# Altium footprint library MOTHER_BOARD_LS1021_v1.0.PcbLib: 69 footprints (part 2 of 5)
Each footprint in its own frame and in the unit in brackets; x right, y up, seen from the top. Pads: shape width x height; smd on the part's side, far side on the other; paste and mask are expansions set on the pad; w line width, h text height; cw(c..) or ccw(c..) is an arc to the next point about the centre after c.
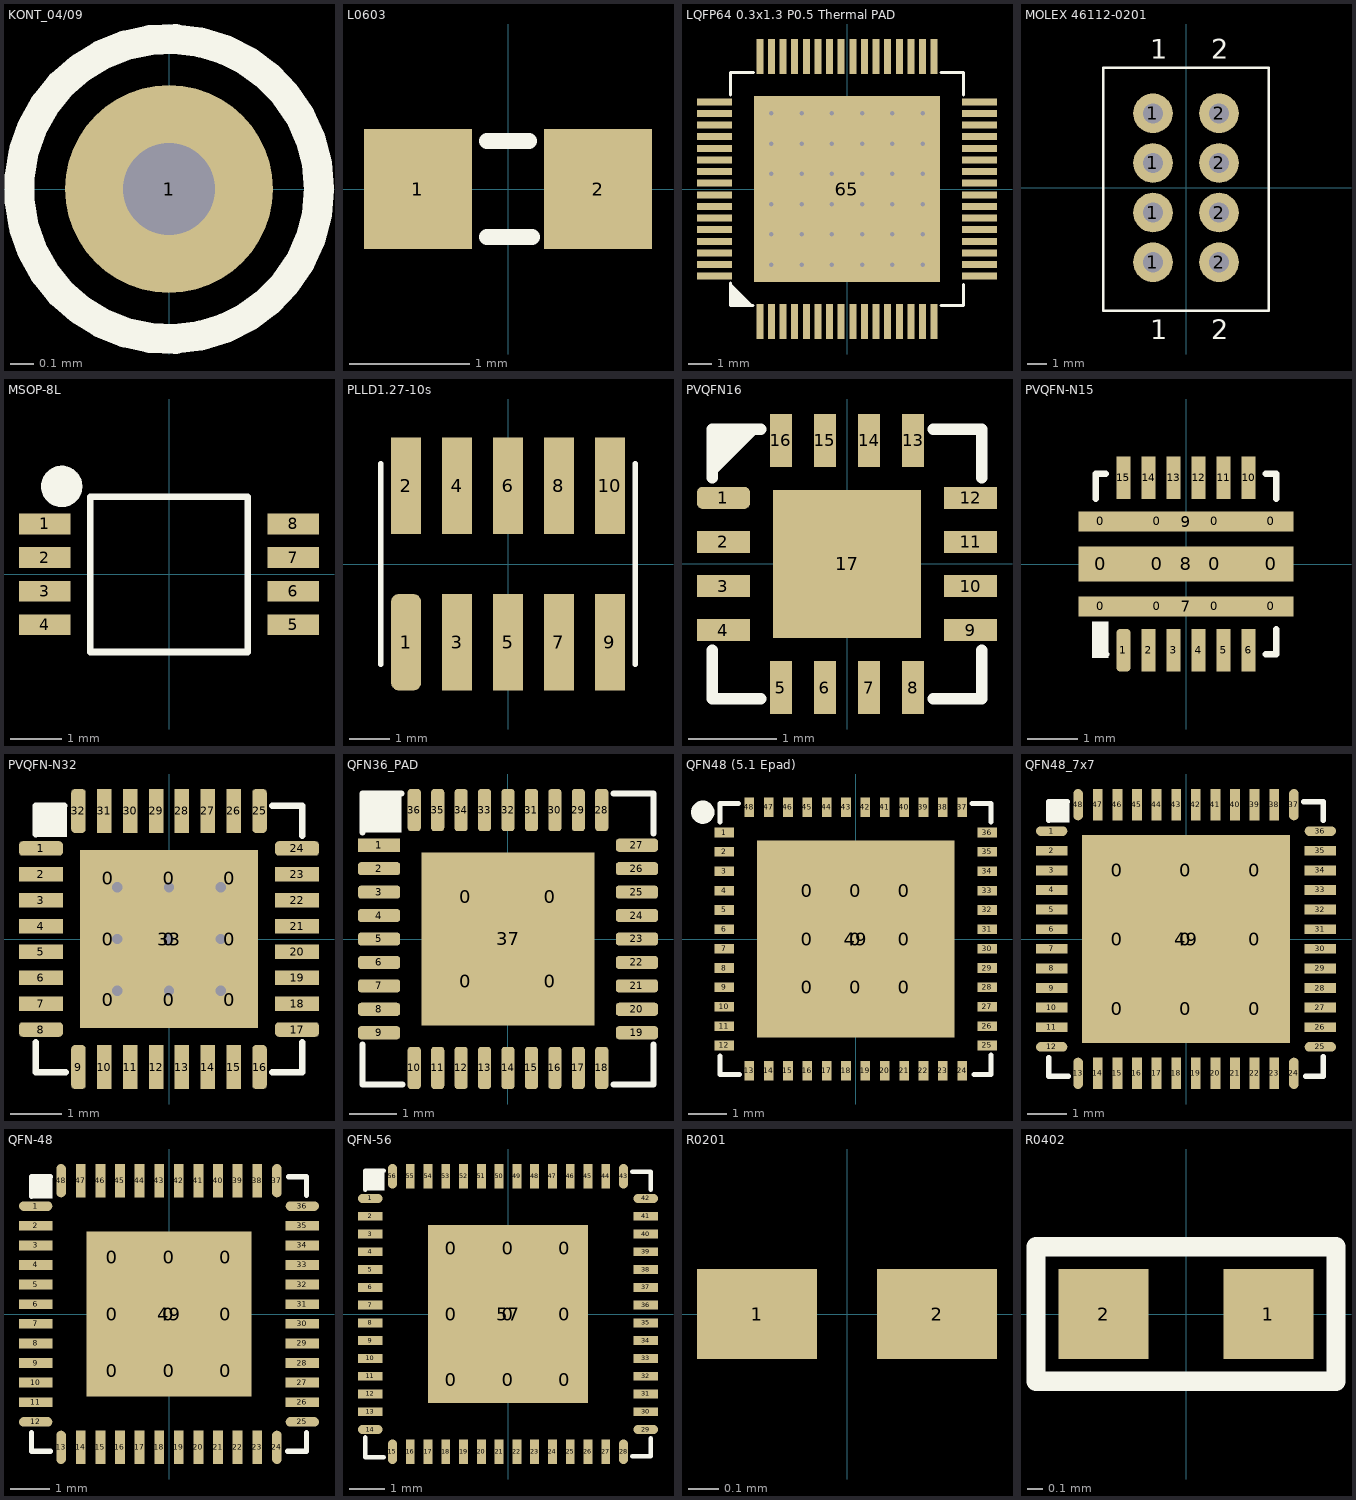
[diagram p1: the footprints below, top view; thin cyan lines are the x and y axes]

## KONT_04/09 [mm]
height 2.7
pads (1):
  round 0.9 hole 0.4: 1(0,0)
Top Overlay:
  circle w0.13: c0,0 r0.65

## L0603 [mm] "Ferrite bead"
height 0.8
pads (2):
  rect 0.9x1 smd paste-0.05 mask+0.05: 1(-0.75,0) 2(0.75,0)
Top Overlay:
  lines w0.13: -0.175,-0.4 0.2,-0.4 ; -0.175,0.4 0.175,0.4
3D body "BLM18P.STEP": height 0.8, standoff -0.01, extent -0.8,-0.41 0.8,0.4

## LQFP64 0.3x1.3 P0.5 Thermal PAD [mm] "TFP410MPAPREP"
height 14.5
pads (65):
  rect 0.3x1.5 smd paste+0 mask+0.05: 1(-3.75,-5.7) 2(-3.25,-5.7) 3(-2.75,-5.7) 4(-2.25,-5.7) 5(-1.75,-5.7) 6(-1.25,-5.7) 7(-0.75,-5.7) 8(-0.25,-5.7) 9(0.25,-5.7) 10(0.75,-5.7) 11(1.25,-5.7) 12(1.75,-5.7) 13(2.25,-5.7) 14(2.75,-5.7) 15(3.25,-5.7) 16(3.75,-5.7) 33(3.75,5.7) 34(3.25,5.7) 35(2.75,5.7) 36(2.25,5.7) 37(1.75,5.7) 38(1.25,5.7) 39(0.75,5.7) 40(0.25,5.7) 41(-0.25,5.7) 42(-0.75,5.7) 43(-1.25,5.7) 44(-1.75,5.7) 45(-2.25,5.7) 46(-2.75,5.7) 47(-3.25,5.7) 48(-3.75,5.7)
  rect 1.5x0.3 smd paste+0 mask+0.05: 17(5.7,-3.75) 18(5.7,-3.25) 19(5.7,-2.75) 20(5.7,-2.25) 21(5.7,-1.75) 22(5.7,-1.25) 23(5.7,-0.75) 24(5.7,-0.25) 25(5.7,0.25) 26(5.7,0.75) 27(5.7,1.25) 28(5.7,1.75) 29(5.7,2.25) 30(5.7,2.75) 31(5.7,3.25) 32(5.7,3.75) 49(-5.7,3.75) 50(-5.7,3.25) 51(-5.7,2.75) 52(-5.7,2.25) 53(-5.7,1.75) 54(-5.7,1.25) 55(-5.7,0.75) 56(-5.7,0.25) 57(-5.7,-0.25) 58(-5.7,-0.75) 59(-5.7,-1.25) 60(-5.7,-1.75) 61(-5.7,-2.25) 62(-5.7,-2.75) 63(-5.7,-3.25) 64(-5.7,-3.75)
  rect 8x8 smd paste-1.5 mask-1.5: 65(0,0)
via 0.65,-0.65 diameter 0.45 hole 0.2
via 0.65,0.65 diameter 0.45 hole 0.2
via 0.65,1.95 diameter 0.45 hole 0.2
via 0.65,3.25 diameter 0.45 hole 0.2
via -0.65,3.25 diameter 0.45 hole 0.2
via -1.95,3.25 diameter 0.45 hole 0.2
via -3.25,3.25 diameter 0.45 hole 0.2
via 1.95,3.25 diameter 0.45 hole 0.2
via 3.25,3.25 diameter 0.45 hole 0.2
via 3.25,1.95 diameter 0.45 hole 0.2
via 1.95,1.95 diameter 0.45 hole 0.2
via 1.95,0.65 diameter 0.45 hole 0.2
via 3.25,0.65 diameter 0.45 hole 0.2
via 3.25,-0.65 diameter 0.45 hole 0.2
via 1.95,-0.65 diameter 0.45 hole 0.2
via 1.95,-1.95 diameter 0.45 hole 0.2
via 3.25,-1.95 diameter 0.45 hole 0.2
via 3.25,-3.25 diameter 0.45 hole 0.2
via 1.95,-3.25 diameter 0.45 hole 0.2
via 0.65,-3.25 diameter 0.45 hole 0.2
via -0.65,-3.25 diameter 0.45 hole 0.2
via -1.95,-3.25 diameter 0.45 hole 0.2
via -3.25,-3.25 diameter 0.45 hole 0.2
via -3.25,-1.95 diameter 0.45 hole 0.2
via -3.25,-0.65 diameter 0.45 hole 0.2
via -3.25,0.65 diameter 0.45 hole 0.2
via -3.25,1.95 diameter 0.45 hole 0.2
via -1.95,1.95 diameter 0.45 hole 0.2
via -1.95,0.65 diameter 0.45 hole 0.2
via -1.95,-0.65 diameter 0.45 hole 0.2
via -1.95,-1.95 diameter 0.45 hole 0.2
via -0.65,-1.95 diameter 0.45 hole 0.2
via -0.65,-0.65 diameter 0.45 hole 0.2
via -0.65,0.65 diameter 0.45 hole 0.2
via -0.65,1.95 diameter 0.45 hole 0.2
via 0.65,-1.95 diameter 0.45 hole 0.2
Top Overlay:
  region: -5,-4.05 -4.05,-5 -5,-5
  lines w0.13: -5,-4.05 -5,-5 -4.05,-5 ; -5,4.05 -5,5 -4.025,5 ; -4.25,-5 -4.15,-5 ; 4.05,-5 5,-5 5,-4.1 ; 4.05,5 5,5 5,4.05
3D body "LQFP-64.step": height 1.56, standoff 0, extent -6,-6 6,6

## MOLEX 46112-0201 [mm]
height 14.5
pads (8):
  round 2 hole 1.02 paste-0.1 mask+0.05: 1(-1.665,-3.75) 1(-1.665,-1.25) 1(-1.665,1.25) 1(-1.665,3.75) 2(1.665,-3.75) 2(1.665,-1.25) 2(1.665,1.25) 2(1.665,3.75)
Top Overlay:
  lines w0.13: -4.166,-6.2 -4.166,6.05 4.165,6.05 4.165,-6.2 -4.166,-6.2
  text "1" at -1.8,-7.625 h1
  text "2" at 1.275,-7.625 h1
  text "2" at 1.275,6.5 h1
  text "1" at -1.8,6.5 h1
3D body "461120201.stp": height 15.22, standoff -2.58, extent -4.166,-6.196 4.166,6.047

## MSOP-8L [mm]
height 0.975
pads (8):
  rect 1x0.4 smd paste-0.05 mask+0.05: 1(-2.4,0.975) 2(-2.4,0.325) 3(-2.4,-0.325) 4(-2.4,-0.975) 5(2.4,-0.975) 6(2.4,-0.325) 7(2.4,0.325) 8(2.4,0.975)
Top Overlay:
  circle w0.4: c-2.075,1.7 r0.2
  lines w0.13: -1.525,-1.5 -1.525,1.5 1.525,1.5 1.525,-1.5 -1.525,-1.5
3D body "WE-TVS_Super_Speed_MSOP-8L.stp": height 0.94, standoff -0.04, extent -2.45,-1.5 2.45,1.5

## PLLD1.27-10s [mm]
height 14.5
pads (10):
  rrect50% 0.75x2.4 smd mask+0.05: 1(-2.54,-1.95)
  rect 0.75x2.4 smd mask+0.05: 2(-2.54,1.95) 3(-1.27,-1.95) 4(-1.27,1.95) 5(0,-1.95) 6(0,1.95) 7(1.27,-1.95) 8(1.27,1.95) 9(2.54,-1.95) 10(2.54,1.95)
Top Overlay:
  lines w0.13: -3.175,-2.5 -3.175,2.5 ; 3.175,-2.5 3.175,2.5
3D body "PLLD1_27-10-S.step": height 3.9, standoff 0, extent -3.185,-2.5 3.165,2.5

## PVQFN16 [mm]
height 14.5
pads (17):
  rrect50% 0.6x0.25 smd paste+0 mask+0.05: 1(-1.4,0.75)
  rect 0.6x0.25 smd paste+0 mask+0.05: 2(-1.4,0.25) 3(-1.4,-0.25) 4(-1.4,-0.75) 9(1.4,-0.75) 10(1.4,-0.25) 11(1.4,0.25) 12(1.4,0.75)
  rect 0.25x0.6 smd paste+0 mask+0.05: 5(-0.75,-1.4) 6(-0.25,-1.4) 7(0.25,-1.4) 8(0.75,-1.4) 13(0.75,1.4) 14(0.25,1.4) 15(-0.25,1.4) 16(-0.75,1.4)
  rect 1.68x1.68 smd paste-0.065 mask+0.05: 17(0,0)
Top Overlay:
  region: -1.524,1.521 -1.525,1.52 -1.525,0.975 -0.975,1.525
  lines w0.13: -1.525,-0.975 -1.525,-1.525 -0.975,-1.525 ; -1.525,0.975 -1.525,1.525 -0.975,1.525 ; 0.975,-1.525 1.525,-1.525 1.525,-0.975 ; 0.975,1.525 1.525,1.525 1.525,0.975
3D body "QFN-16_3x3.STEP": height 0.9, standoff 0, extent -1.524,-1.521 1.518,1.521

## PVQFN-N15 [mm]
height 14.5
pads (27):
  rect 0.8x0.3 on Top Paste paste+0 mask+0: 0(-1.7,-0.85) 0(-1.7,0.85) 0(1.7,-0.85) 0(1.7,0.85)
  rect 0.8x0.55 on Top Paste paste+0 mask+0: 0(-1.7,0) 0(1.7,0)
  rect 0.85x0.3 on Top Paste paste+0 mask+0: 0(-0.58,-0.85) 0(-0.58,0.85) 0(0.58,-0.85) 0(0.58,0.85)
  rect 0.85x0.55 on Top Paste paste+0 mask+0: 0(-0.58,0) 0(0.58,0)
  rrect50% 0.28x0.85 smd paste-0.03 mask+0.05: 1(-1.25,-1.725)
  rect 0.28x0.85 smd paste-0.03 mask+0.05: 2(-0.75,-1.725) 3(-0.25,-1.725) 4(0.25,-1.725) 5(0.75,-1.725) 6(1.25,-1.725) 10(1.25,1.725) 11(0.75,1.725) 12(0.25,1.725) 13(-0.25,1.725) 14(-0.75,1.725) 15(-1.25,1.725)
  rect 4.3x0.4 smd paste-10 mask+0.05: 7(0,-0.85) 9(0,0.85)
  rect 4.3x0.7 smd paste-10 mask+0.05: 8(0,0)
Top Overlay:
  region: -1.875,-1.15 -1.55,-1.15 -1.55,-1.875 -1.875,-1.875
  lines w0.13: -1.8,-1.3 -1.8,-1.8 -1.6,-1.8 ; -1.8,1.3 -1.8,1.8 -1.6,1.8 ; 1.6,-1.8 1.8,-1.8 1.8,-1.3 ; 1.6,1.8 1.8,1.8 1.8,1.3
3D body "PVQFN-N15(корпус).STEP": height 1, standoff 0, extent -1.8,-1.8 1.8,1.8

## PVQFN-N32 [mm] "PQFN, 32-Leads, Body 5,00x5,00mm, Pitch 0,50mm, Thermal Pad 3,45x3,45mm, IPC Medium Density"
height 1
pads (42):
  rect 1x1 on Top Paste paste+0 mask+0: 0(-1.175,-1.175) 0(-1.175,0) 0(-1.175,1.175) 0(0,-1.175) 0(0,0) 0(0,1.175) 0(1.175,-1.175) 0(1.175,0) 0(1.175,1.175)
  rrect50% 0.85x0.28 smd paste-0.03 mask+0.05: 1(-2.475,1.75) 8(-2.475,-1.75) 17(2.475,-1.75) 24(2.475,1.75)
  rect 0.85x0.28 smd paste-0.03 mask+0.05: 2(-2.475,1.25) 3(-2.475,0.75) 4(-2.475,0.25) 5(-2.475,-0.25) 6(-2.475,-0.75) 7(-2.475,-1.25) 18(2.475,-1.25) 19(2.475,-0.75) 20(2.475,-0.25) 21(2.475,0.25) 22(2.475,0.75) 23(2.475,1.25)
  rrect50% 0.28x0.85 smd paste-0.03 mask+0.05: 9(-1.75,-2.475) 16(1.75,-2.475) 25(1.75,2.475) 32(-1.75,2.475)
  rect 0.28x0.85 smd paste-0.03 mask+0.05: 10(-1.25,-2.475) 11(-0.75,-2.475) 12(-0.25,-2.475) 13(0.25,-2.475) 14(0.75,-2.475) 15(1.25,-2.475) 26(1.25,2.475) 27(0.75,2.475) 28(0.25,2.475) 29(-0.25,2.475) 30(-0.75,2.475) 31(-1.25,2.475)
  rect 3.45x3.45 smd paste-5 mask+0.05: 33(0,0)
via 1,1 diameter 0.45 hole 0.2
via 0,1 diameter 0.45 hole 0.2
via -1,1 diameter 0.45 hole 0.2
via -1,0 diameter 0.45 hole 0.2
via 0,0 diameter 0.45 hole 0.2
via 1,0 diameter 0.45 hole 0.2
via 1,-1 diameter 0.45 hole 0.2
via 0,-1 diameter 0.45 hole 0.2
via -1,-1 diameter 0.45 hole 0.2
Top Overlay:
  region: -2.575,1.975 -1.975,1.975 -1.975,2.575 -2.575,2.575
  lines w0.13: -2.575,-2 -2.575,-2.575 -2,-2.575 ; -2.575,2.025 -2.575,2.575 -2.025,2.575 ; 2,-2.575 2.575,-2.575 2.575,-2 ; 2,2.575 2.575,2.575 2.575,2
3D body "PVQFN-N32.step": height 1, standoff 0, extent -2.575,-2.575 2.575,2.575

## QFN36_PAD [mm]
height 2.7
pads (41):
  rect 1.2x1.2 on Top Paste: 0(-0.9,-0.9) 0(-0.9,0.9) 0(0.9,-0.9) 0(0.9,0.9)
  rect 0.9x0.28 smd paste-0.03 mask+0.05: 1(-2.75,2)
  rrect50% 0.9x0.28 smd paste-0.03 mask+0.05: 2(-2.75,1.5) 3(-2.75,1) 4(-2.75,0.5) 5(-2.75,0) 6(-2.75,-0.5) 7(-2.75,-1) 8(-2.75,-1.5) 9(-2.75,-2) 19(2.75,-2) 20(2.75,-1.5) 21(2.75,-1) 22(2.75,-0.5) 23(2.75,0) 24(2.75,0.5) 25(2.75,1) 26(2.75,1.5) 27(2.75,2)
  rrect50% 0.28x0.9 smd paste-0.03 mask+0.05: 10(-2,-2.75) 11(-1.5,-2.75) 12(-1,-2.75) 13(-0.5,-2.75) 14(0,-2.75) 15(0.5,-2.75) 16(1,-2.75) 17(1.5,-2.75) 18(2,-2.75) 28(2,2.75) 29(1.5,2.75) 30(1,2.75) 31(0.5,2.75) 32(0,2.75) 33(-0.5,2.75) 34(-1,2.75) 35(-1.5,2.75) 36(-2,2.75)
  rect 3.7x3.7 smd paste-5 mask+0.05: 37(0,0)
Top Overlay:
  region: -3.103,2.275 -2.275,2.275 -2.275,3.1 -3.103,3.1
  lines w0.13: -3.103,2.275 -3.103,3.1 -2.275,3.1 ; -3.1,-2.25 -3.1,-3.1 -2.25,-3.1 ; 2.25,-3.1 3.1,-3.1 3.1,-2.25 ; 2.25,3.1 3.1,3.1 3.1,2.25
3D body "QFN36 (6x6).step": height 0.9, standoff 0.01, extent -3.103,-3.103 3.103,3.103

## QFN48 (5.1 Epad) [mm] "KSZ9031RNXCC"
height 0.9
pads (58):
  rect 1x1 on Top Paste paste+0 mask+0: 0(-1.25,-1.25) 0(-1.25,0) 0(-1.25,1.25) 0(0,-1.25) 0(0,0) 0(0,1.25) 0(1.25,-1.25) 0(1.25,0) 0(1.25,1.25)
  rect 0.5x0.25 smd paste+0 mask+0.05: 1(-3.4,2.75) 2(-3.4,2.25) 3(-3.4,1.75) 4(-3.4,1.25) 5(-3.4,0.75) 6(-3.4,0.25) 7(-3.4,-0.25) 8(-3.4,-0.75) 9(-3.4,-1.25) 10(-3.4,-1.75) 11(-3.4,-2.25) 12(-3.4,-2.75) 25(3.4,-2.75) 26(3.4,-2.25) 27(3.4,-1.75) 28(3.4,-1.25) 29(3.4,-0.75) 30(3.4,-0.25) 31(3.4,0.25) 32(3.4,0.75) 33(3.4,1.25) 34(3.4,1.75) 35(3.4,2.25) 36(3.4,2.75)
  rect 0.25x0.5 smd paste+0 mask+0.05: 13(-2.75,-3.4) 14(-2.25,-3.4) 15(-1.75,-3.4) 16(-1.25,-3.4) 17(-0.75,-3.4) 18(-0.25,-3.4) 19(0.25,-3.4) 20(0.75,-3.4) 21(1.25,-3.4) 22(1.75,-3.4) 23(2.25,-3.4) 24(2.75,-3.4) 37(2.75,3.4) 38(2.25,3.4) 39(1.75,3.4) 40(1.25,3.4) 41(0.75,3.4) 42(0.25,3.4) 43(-0.25,3.4) 44(-0.75,3.4) 45(-1.25,3.4) 46(-1.75,3.4) 47(-2.25,3.4) 48(-2.75,3.4)
  rect 5.1x5.1 smd paste-5 mask+0.05: 49(0,0)
Top Overlay:
  circle w0.3: c-3.95,3.275 r0.15
  lines w0.13: -3.5,-3.025 -3.5,-3.5 -3,-3.5 ; -3.5,3.025 -3.5,3.5 -3.025,3.5 ; 3,3.5 3.5,3.5 3.5,3.025 ; 3.05,-3.5 3.5,-3.5 3.5,-3
3D body: height 0.9, standoff 0.05, extent -3.5,-3.5 3.5,3.5

## QFN48_7x7 [mm]
height 0.9
pads (58):
  rect 1.5x1.5 on Top Paste paste+0 mask+0: 0(-1.75,-1.775) 0(-1.75,0) 0(-1.75,1.75) 0(0,-1.775) 0(0,0) 0(0,1.75) 0(1.75,-1.775) 0(1.75,1.75) 0(1.75,0)
  oval 0.8x0.25 smd paste-0.02 mask+0.05: 1(-3.425,2.75) 12(-3.425,-2.75) 25(3.425,-2.75) 36(3.425,2.75)
  rect 0.8x0.25 smd paste-0.02 mask+0.05: 2(-3.425,2.25) 3(-3.425,1.75) 4(-3.425,1.25) 5(-3.425,0.75) 6(-3.425,0.25) 7(-3.425,-0.25) 8(-3.425,-0.75) 9(-3.425,-1.25) 10(-3.425,-1.75) 11(-3.425,-2.25) 26(3.425,-2.25) 27(3.425,-1.75) 28(3.425,-1.25) 29(3.425,-0.75) 30(3.425,-0.25) 31(3.425,0.25) 32(3.425,0.75) 33(3.425,1.25) 34(3.425,1.75) 35(3.425,2.25)
  oval 0.25x0.8 smd paste-0.02 mask+0.05: 13(-2.75,-3.425) 24(2.75,-3.425) 37(2.75,3.425) 48(-2.75,3.425)
  rect 0.25x0.8 smd paste-0.02 mask+0.05: 14(-2.25,-3.425) 15(-1.75,-3.425) 16(-1.25,-3.425) 17(-0.75,-3.425) 18(-0.25,-3.425) 19(0.25,-3.425) 20(0.75,-3.425) 21(1.25,-3.425) 22(1.75,-3.425) 23(2.25,-3.425) 38(2.25,3.425) 39(1.75,3.425) 40(1.25,3.425) 41(0.75,3.425) 42(0.25,3.425) 43(-0.25,3.425) 44(-0.75,3.425) 45(-1.25,3.425) 46(-1.75,3.425) 47(-2.25,3.425)
  rect 5.3x5.3 smd paste-5 mask+0.05: 49(0,0)
Top Overlay:
  region: -3.5,2.975 -2.975,2.975 -2.975,3.5 -3.5,3.5
  lines w0.13: -3.5,-3.025 -3.5,-3.5 -3,-3.5 ; -3.5,3.025 -3.5,3.5 -3.025,3.5 ; 3,3.5 3.5,3.5 3.5,3.025 ; 3.05,-3.5 3.5,-3.5 3.5,-3
3D body: height 0.9, standoff 0.05, extent -3.5,-3.5 3.5,3.5

## QFN-48 [mm]
height 0.85
pads (58):
  rect 1.2x1.2 on Top Paste paste+0 mask+0: 0(-1.45,-1.45) 0(-1.45,0) 0(-1.45,1.45) 0(0,0) 0(0,-1.45) 0(0,1.45) 0(1.45,-1.45) 0(1.45,0) 0(1.45,1.45)
  oval 0.85x0.25 smd paste-0.025 mask+0.05: 1(-3.4,2.75) 12(-3.4,-2.75) 25(3.4,-2.75) 36(3.4,2.75)
  rect 0.85x0.25 smd paste-0.025 mask+0.05: 2(-3.4,2.25) 3(-3.4,1.75) 4(-3.4,1.25) 5(-3.4,0.75) 6(-3.4,0.25) 7(-3.4,-0.25) 8(-3.4,-0.75) 9(-3.4,-1.25) 10(-3.4,-1.75) 11(-3.4,-2.25) 26(3.4,-2.25) 27(3.4,-1.75) 28(3.4,-1.25) 29(3.4,-0.75) 30(3.4,-0.25) 31(3.4,0.25) 32(3.4,0.75) 33(3.4,1.25) 34(3.4,1.75) 35(3.4,2.25)
  oval 0.25x0.85 smd paste-0.025 mask+0.05: 13(-2.75,-3.4) 24(2.75,-3.4) 37(2.75,3.4) 48(-2.75,3.4)
  rect 0.25x0.85 smd paste-0.025 mask+0.05: 14(-2.25,-3.4) 15(-1.75,-3.4) 16(-1.25,-3.4) 17(-0.75,-3.4) 18(-0.25,-3.4) 19(0.25,-3.4) 20(0.75,-3.4) 21(1.25,-3.4) 22(1.75,-3.4) 23(2.25,-3.4) 38(2.25,3.4) 39(1.75,3.4) 40(1.25,3.4) 41(0.75,3.4) 42(0.25,3.4) 43(-0.25,3.4) 44(-0.75,3.4) 45(-1.25,3.4) 46(-1.75,3.4) 47(-2.25,3.4)
  rect 4.2x4.2 smd paste-5 mask+0.075: 49(0,0)
Top Overlay:
  region: -3.51,2.95 -2.975,2.95 -2.975,3.5 -3.5,3.5 -3.51,3.51
  lines w0.13: -3.51,-3.025 -3.51,-3.5 -3.025,-3.5 ; -3.51,3 -3.51,3.5 -3.025,3.5 ; 3.025,-3.5 3.51,-3.5 3.51,-3.025 ; 3.05,3.5 3.51,3.5 3.51,3.025 ; 3.51,-3.025 3.51,-3.025
3D body "QFN48_7x7.step": height 0.78, standoff -0.02, extent -3.51,-3.51 3.51,3.51

## QFN-56 [mm] "QFN, 56-Leads, Body 8,00x8,00mm, Pitch 0,50mm, Thermal Pad 5,90x5,90mm, IPC Medium Density"
height 1
pads (66):
  rect 1.2x1.2 on Top Paste paste+0 mask+0: 0(-1.6,-1.85) 0(-1.6,0) 0(-1.6,1.85) 0(0,-1.85) 0(0,0) 0(0,1.85) 0(1.6,-1.85) 0(1.6,0) 0(1.6,1.85)
  oval 0.69x0.25 smd paste-0.02 mask+0.05: 1(-3.875,3.25) 14(-3.875,-3.25) 29(3.875,-3.25) 42(3.875,3.25)
  rect 0.69x0.25 smd paste-0.02 mask+0.05: 2(-3.875,2.75) 3(-3.875,2.25) 4(-3.875,1.75) 5(-3.875,1.25) 6(-3.875,0.75) 7(-3.875,0.25) 8(-3.875,-0.25) 9(-3.875,-0.75) 10(-3.875,-1.25) 11(-3.875,-1.75) 12(-3.875,-2.25) 13(-3.875,-2.75) 30(3.875,-2.75) 31(3.875,-2.25) 32(3.875,-1.75) 33(3.875,-1.25) 34(3.875,-0.75) 35(3.875,-0.25) 36(3.875,0.25) 37(3.875,0.75) 38(3.875,1.25) 39(3.875,1.75) 40(3.875,2.25) 41(3.875,2.75)
  oval 0.25x0.69 smd paste-0.02 mask+0.05: 15(-3.25,-3.875) 28(3.25,-3.875) 43(3.25,3.875) 56(-3.25,3.875)
  rect 0.25x0.69 smd paste-0.02 mask+0.05: 16(-2.75,-3.875) 17(-2.25,-3.875) 18(-1.75,-3.875) 19(-1.25,-3.875) 20(-0.75,-3.875) 21(-0.25,-3.875) 22(0.25,-3.875) 23(0.75,-3.875) 24(1.25,-3.875) 25(1.75,-3.875) 26(2.25,-3.875) 27(2.75,-3.875) 44(2.75,3.875) 45(2.25,3.875) 46(1.75,3.875) 47(1.25,3.875) 48(0.75,3.875) 49(0.25,3.875) 50(-0.25,3.875) 51(-0.75,3.875) 52(-1.25,3.875) 53(-1.75,3.875) 54(-2.25,3.875) 55(-2.75,3.875)
  rect 4.5x5 smd paste-5 mask+0.075: 57(0,0)
Top Overlay:
  region: -4.015,4.025 -3.475,4.025 -3.475,3.475 -4.015,3.475
  lines w0.13: -4.015,-3.475 -4.015,-4.025 -3.5,-4.025 ; -4.015,3.5 -4.015,4.025 -3.5,4.025 ; 3.5,-4 4.015,-4 4.015,-3.5 ; 3.5,4 4.015,4 4.015,3.5
Mechanical 15:
  lines w0.1: -0.5,0 0.5,0 ; 0,-0.5 0,0.5
3D body "QFN56.step": height 0.95, standoff 0, extent -4.015,-4.015 4.015,4.015

## R0201 [mm]
height 1.6
pads (2):
  rect 0.4x0.3 smd paste-3 mask+0.05: 1(-0.3,0) 2(0.3,0)
Top Paste:
  region: 0.5,-0.15 0.23,-0.15 0.1,0 0.23,0.15 0.5,0.15
  region: -0.5,0.15 -0.23,0.15 -0.1,0 -0.23,-0.15 -0.5,-0.15
3D body "R0201.step": height 0.34, standoff 0, extent -0.34,-0.165 0.34,0.165

## R0402 [mm] "Р1-12-0,062"
height 0.4
pads (2):
  rect 0.6x0.6 smd paste-0.05 mask+0.05: 1(0.55,0) 2(-0.55,0)
Top Overlay:
  lines w0.13: -1,-0.45 1,-0.45 1,0.45 -1,0.45 -1,-0.45
3D body "R0402.STEP": height 0.3, standoff 0, extent -0.5,-0.25 0.5,0.25